# Altium footprint library InductorsRLB.PcbLib: 18 footprints (part 1 of 2)
Each footprint in its own frame and in the unit in brackets; x right, y up, seen from the top. Pads: shape width x height; smd on the part's side, far side on the other; paste and mask are expansions set on the pad; w line width, h text height; cw(c..) or ccw(c..) is an arc to the next point about the centre after c.
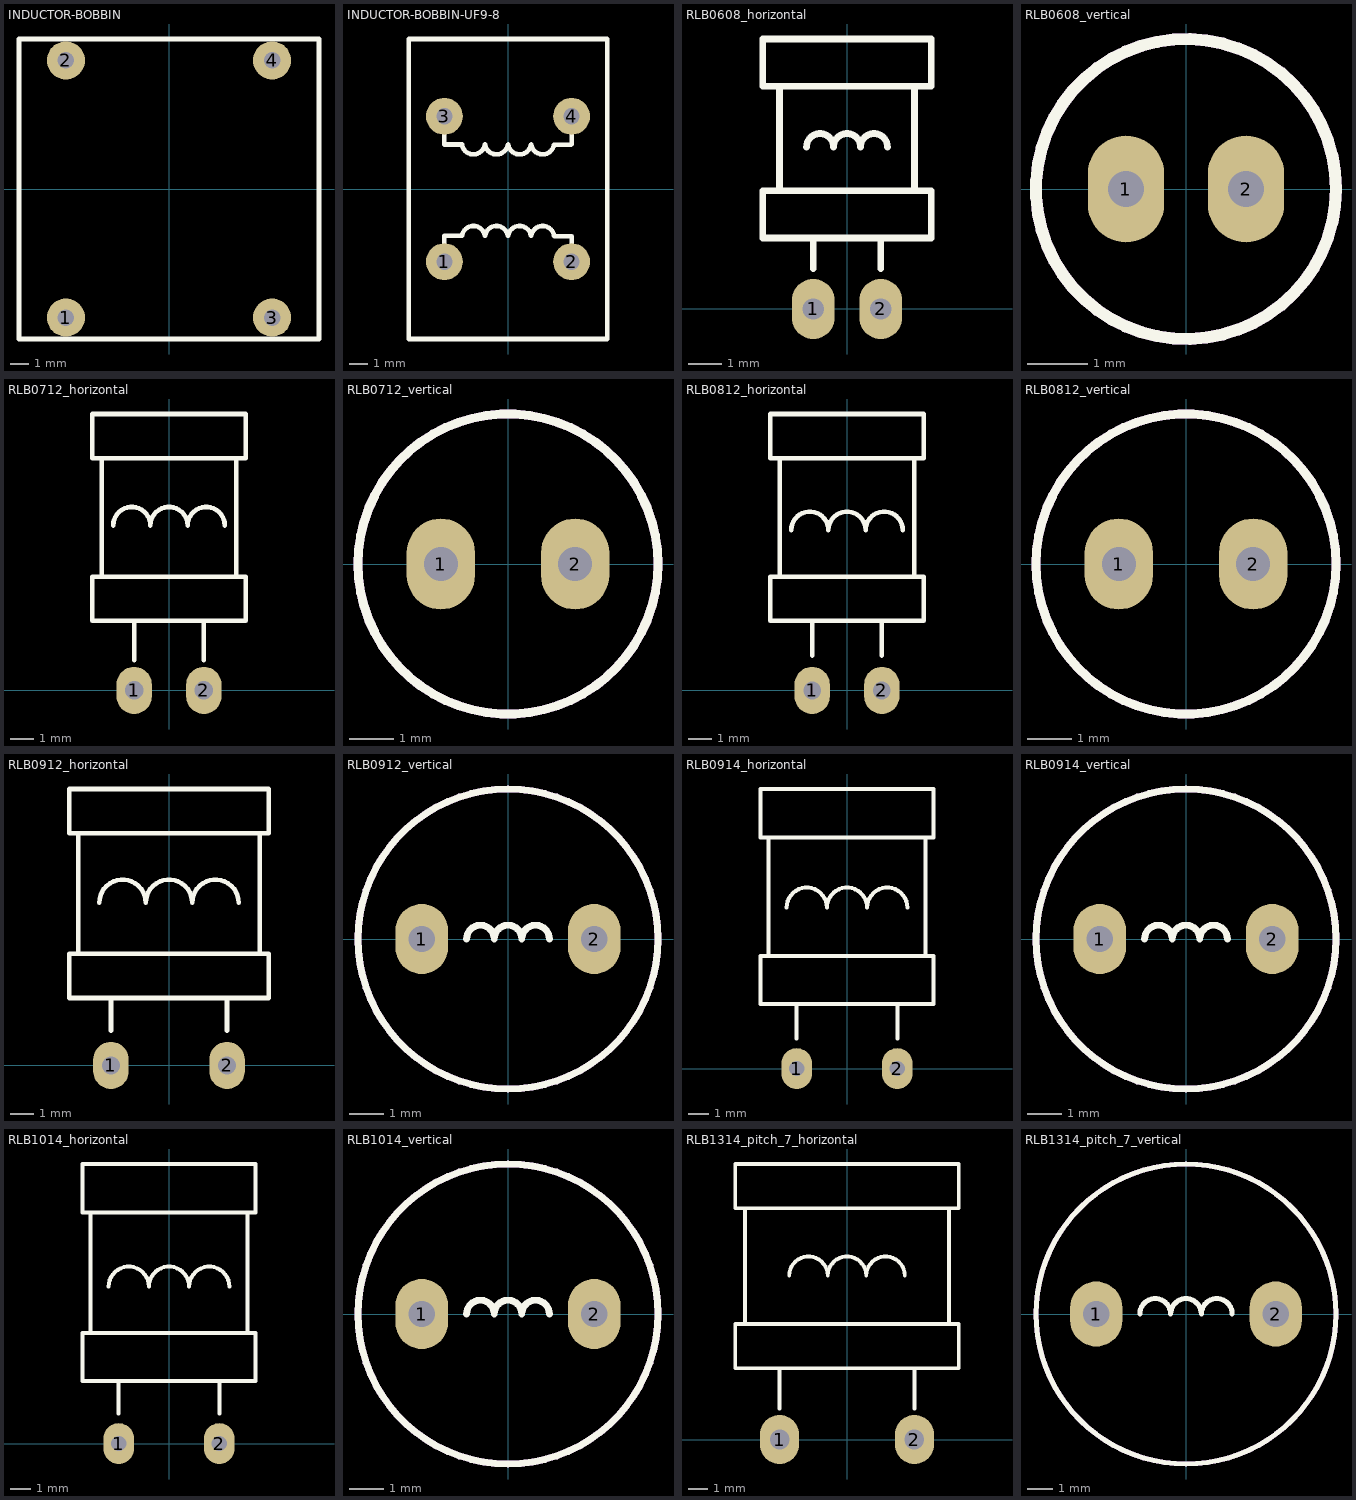
[diagram p0: the footprints below, top view; thin cyan lines are the x and y axes]

## INDUCTOR-BOBBIN [mil]
pads (4):
  round 80 hole 35: 1(-216.54,-270) 2(-216.54,270) 3(216.54,-270) 4(216.54,270)
Top Overlay:
  lines w10: -314.96,-314.96 -314.96,314.96 314.96,314.96 314.96,-314.96 -314.96,-314.96

## INDUCTOR-BOBBIN-UF9-8 [mil]
pads (4):
  round 80 hole 35: 1(-137.8,-157.48) 2(137.8,-157.48) 3(-137.8,157.48) 4(137.8,157.48)
Top Overlay:
  lines w10: -137.8,-125 -137.8,-100.89 -99.66,-100.89 cw(c-75,-105) -50.25,-101.46 ; -137.8,125 -137.8,97.2 -137.8,96.46 -99.75,96.46 ccw(c-75,100) -50.34,95.89 ; -49.75,96.46 ccw(c-25,100) -0.34,95.89 ; -49.66,-100.89 cw(c-25,-105) -0.25,-101.46 ; 0.25,96.46 ccw(c25,100) 49.66,95.89 ; 0.34,-100.89 cw(c25,-105) 49.75,-101.46 ; 50.25,96.46 ccw(c75,100) 99.66,95.89 136.48,95.89 137.8,97.2 137.8,125 ; 50.34,-100.89 cw(c75,-105) 99.75,-101.46 100.49,-102.2 137.8,-102.2 137.8,-125 ; -215,-325 215,-325 215,325 -215,325 -215,-325
3D body "User Library-UF9_8.STEP": height 602.36, standoff -118.11, extent -208.66,-318.15 208.67,317.94

## RLB0608_horizontal [mil]
pads (2):
  oval 50x70 hole 25 mask+2.76: 1(-39.37,0) 2(39.37,0)
Top Overlay:
  lines w7.87: -78.74,137.8 -78.74,259.84 ; -47.24,188.98 cw(c-31.5,188.98) -15.75,188.98 cw(c0,188.98) 15.75,188.98 cw(c31.5,188.98) 47.24,188.98 ; -39.37,47.24 -39.37,82.68 ; 39.37,47.24 39.37,82.68 ; 78.74,137.8 78.74,259.84 ; -98.43,82.68 98.43,82.68 98.43,137.8 -98.43,137.8 -98.43,82.68 ; -98.43,259.84 -98.43,314.96 98.43,314.96 98.43,259.84 -98.43,259.84
3D body "RLB0608_horizontal.stp": height 200.69, standoff -118.11, extent -98.43,-9.84 98.42,314.96

## RLB0608_vertical [mm]
pads (2):
  oval 1.27x1.778 hole 0.6 mask+0.07: 1(-1,0) 2(1,0)
Top Overlay:
  circle w0.2: c0,0 r2.5
Mechanical 3:
  circle w0.2: c0,0 r2.5
3D body "RLB0608_vertical.stp": height 6.5, standoff -3, extent -2.5,-2.497 2.5,2.498

## RLB0712_horizontal [mil]
pads (2):
  oval 60x80 hole 31.5 mask+2.76: 1(-59.06,0) 2(59.06,0)
Top Overlay:
  lines w7.87: -114.17,192.91 -114.17,393.7 ; -94.49,279.53 cw(c-62.99,279.53) -31.5,279.53 cw(c0,279.53) 31.5,279.53 cw(c62.99,279.53) 94.49,279.53 ; -59.06,51.18 -59.06,118.11 ; 59.06,51.18 59.06,118.11 ; 114.17,192.91 114.17,393.7 ; -129.92,118.11 -129.92,192.91 129.92,192.91 129.92,118.11 -129.92,118.11 ; -129.92,393.7 129.92,393.7 129.92,468.5 -129.92,468.5 -129.92,393.7
3D body "RLB0712_horizontal.stp": height 267.72, standoff -118.11, extent -131.89,-12.79 131.89,470.48

## RLB0712_vertical [mil]
pads (2):
  oval 60x80 hole 30 mask+2.76: 1(-59.06,0) 2(59.06,0)
Top Overlay:
  circle w7.87: c0,0 r131.89
Mechanical 3:
  circle w7.87: c0,0 r131.89
3D body "RLB0712_vertical.stp": height 393.7, standoff -118.11, extent -131.89,-131.89 131.89,131.89

## RLB0812_horizontal [mil]
pads (2):
  oval 60x80 hole 30 mask+2.76: 1(-59.06,0) 2(59.06,0)
Top Overlay:
  lines w7.87: -114.17,192.91 -114.17,393.7 ; -94.49,271.65 cw(c-62.99,271.65) -31.5,271.65 cw(c0,271.65) 31.5,271.65 cw(c62.99,271.65) 94.49,271.65 ; -59.06,59.06 -59.06,118.11 ; 59.06,59.06 59.06,118.11 ; 114.17,192.91 114.17,393.7 ; -129.92,118.11 -129.92,192.91 129.92,192.91 129.92,118.11 -129.92,118.11 ; -129.92,393.7 129.92,393.7 129.92,468.5 -129.92,468.5 -129.92,393.7
3D body "RLB0812_horizontal.stp": height 267.72, standoff -118.11, extent -131.89,-12.79 131.89,470.48

## RLB0812_vertical [mil]
pads (2):
  oval 60x80 hole 30 mask+2.76: 1(-59.06,0) 2(59.06,0)
Top Overlay:
  circle w7.87: c0,0 r131.89
Mechanical 3:
  circle w7.87: c0,0 r131.89
3D body "RLB0812_vertical.stp": height 393.7, standoff -118.11, extent -131.89,-131.89 131.89,131.89

## RLB0912_horizontal [mil]
pads (2):
  oval 60x80 hole 30 mask+2.76: 1(-98.43,0) 2(98.43,0)
Top Overlay:
  lines w7.87: -153.54,188.98 -153.54,393.7 ; -118.11,275.59 cw(c-78.74,275.59) -39.37,275.59 cw(c0,275.59) 39.37,275.59 cw(c78.74,275.59) 118.11,275.59 ; -98.43,59.06 -98.43,114.17 ; 98.43,59.06 98.43,114.17 ; 153.54,188.98 153.54,393.7 ; -169.29,114.17 169.29,114.17 169.29,188.98 -169.29,188.98 -169.29,114.17 ; -169.29,393.7 169.29,393.7 169.29,468.5 -169.29,468.5 -169.29,393.7
3D body "RLB0912_horizontal.stp": height 346.33, standoff -118.11, extent -171.26,-12.79 171.26,470.48

## RLB0912_vertical [mil]
pads (2):
  oval 60x80 hole 30 mask+2.76: 1(-98.43,0) 2(98.43,0)
Top Overlay:
  circle w7.87: c0,0 r171.26
  lines w7.87: -47.24,0 cw(c-31.5,0) -15.75,0 cw(c0,0) 15.75,0 cw(c31.5,0) 47.24,0
Mechanical 3:
  circle w7.87: c0,0 r171.26
3D body "RLB0912_vertical.stp": height 393.7, standoff -118.11, extent -171.26,-171.13 171.26,171.14

## RLB0914_horizontal [mil]
pads (2):
  oval 60x80 hole 30 mask+2.76: 1(-98.43,0) 2(98.43,0)
Top Overlay:
  lines w7.87: -153.54,220.47 -153.54,452.76 ; -118.11,314.96 cw(c-78.74,314.96) -39.37,314.96 cw(c0,314.96) 39.37,314.96 cw(c78.74,314.96) 118.11,314.96 ; -98.43,59.06 -98.43,125.98 ; 98.43,59.06 98.43,125.98 ; 153.54,220.47 153.54,452.76 ; -169.29,125.98 169.29,125.98 169.29,220.47 -169.29,220.47 -169.29,125.98 ; -169.29,452.76 -169.29,547.24 169.29,547.24 169.29,452.76 -169.29,452.76
3D body "RLB0914_horizontal.stp": height 346.33, standoff -118.11, extent -171.26,-12.79 171.26,549.22

## RLB0914_vertical [mil]
pads (2):
  oval 60x80 hole 30 mask+2.76: 1(-98.43,0) 2(98.43,0)
Top Overlay:
  circle w7.87: c0,0 r171.26
  lines w7.87: -47.24,0 cw(c-31.5,0) -15.75,0 cw(c0,0) 15.75,0 cw(c31.5,0) 47.24,0
Mechanical 3:
  circle w7.87: c0,0 r171.26
3D body "RLB0914_vertical.stp": height 472.44, standoff -118.11, extent -171.26,-171.13 171.26,171.14

## RLB1014_horizontal [mil]
pads (2):
  oval 60x80 hole 30 mask+2.76: 1(-98.43,0) 2(98.43,0)
Top Overlay:
  lines w7.87: -153.54,216.54 -153.54,452.76 ; -118.11,307.09 cw(c-78.74,307.09) -39.37,307.09 cw(c0,307.09) 39.37,307.09 cw(c78.74,307.09) 118.11,307.09 ; -98.43,59.06 -98.43,122.05 ; 98.43,59.06 98.43,122.05 ; 153.54,216.54 153.54,452.76 ; -169.29,122.05 -169.29,216.54 169.29,216.54 169.29,122.05 -169.29,122.05 ; -169.29,452.76 169.29,452.76 169.29,547.24 -169.29,547.24 -169.29,452.76
3D body "RLB1014_horizontal.stp": height 346.33, standoff -118.11, extent -171.26,-12.79 171.26,549.22

## RLB1014_vertical [mil]
pads (2):
  oval 60x80 hole 30 mask+2.76: 1(-98.43,0) 2(98.43,0)
Top Overlay:
  circle w7.87: c0,0 r171.26
  lines w7.87: -47.24,0 cw(c-31.5,0) -15.75,0 cw(c0,0) 15.75,0 cw(c31.5,0) 47.24,0
Mechanical 3:
  circle w7.87: c0,0 r171.26
3D body "RLB1014_vertical.stp": height 472.44, standoff -118.11, extent -171.26,-171.13 171.26,171.14

## RLB1314_pitch_7_horizontal [mil]
pads (2):
  oval 80x100 hole 40 mask+2.76: 1(-137.8,0) 2(137.8,0)
Top Overlay:
  lines w7.87: -208.66,236.22 -208.66,472.44 ; -137.8,62.99 -137.8,145.67 ; -118.11,334.65 cw(c-78.74,334.65) -39.37,334.65 cw(c0,334.65) 39.37,334.65 cw(c78.74,334.65) 118.11,334.65 ; 137.8,62.99 137.8,145.67 ; 208.66,236.22 208.66,472.44 ; -228.35,145.67 -228.35,236.22 228.35,236.22 228.35,145.67 -228.35,145.67 ; -228.35,472.44 228.35,472.44 228.35,562.99 -228.35,562.99 -228.35,472.44
3D body "RLB1314_pitch7_horizontal.stp": height 464.57, standoff -118.11, extent -230.32,-15.74 230.31,566.93

## RLB1314_pitch_7_vertical [mil]
pads (2):
  oval 80x100 hole 40 mask+2.76: 1(-137.8,0) 2(137.8,0)
Top Overlay:
  circle w7.87: c0,0 r230.31
  lines w7.87: -70.87,0 cw(c-47.24,0) -23.62,0 cw(c0,0) 23.62,0 cw(c47.24,0) 70.87,0
Mechanical 3:
  circle w7.87: c0,0 r230.31
  lines w7.87: -173.23,0 -102.36,0 ; -137.8,-35.43 -137.8,35.43 ; 102.36,0 173.23,0 ; 137.8,-35.43 137.8,35.43
3D body "RLB1314_pitch7_vertical.stp": height 472.44, standoff -118.11, extent -230.32,-230.31 230.31,230.32